# Altium footprint library Toi Library.PcbLib: 740 footprints (part 30 of 47)
Each footprint in its own frame and in the unit in brackets; x right, y up, seen from the top. Pads: shape width x height; smd on the part's side, far side on the other; paste and mask are expansions set on the pad; w line width, h text height; cw(c..) or ccw(c..) is an arc to the next point about the centre after c.
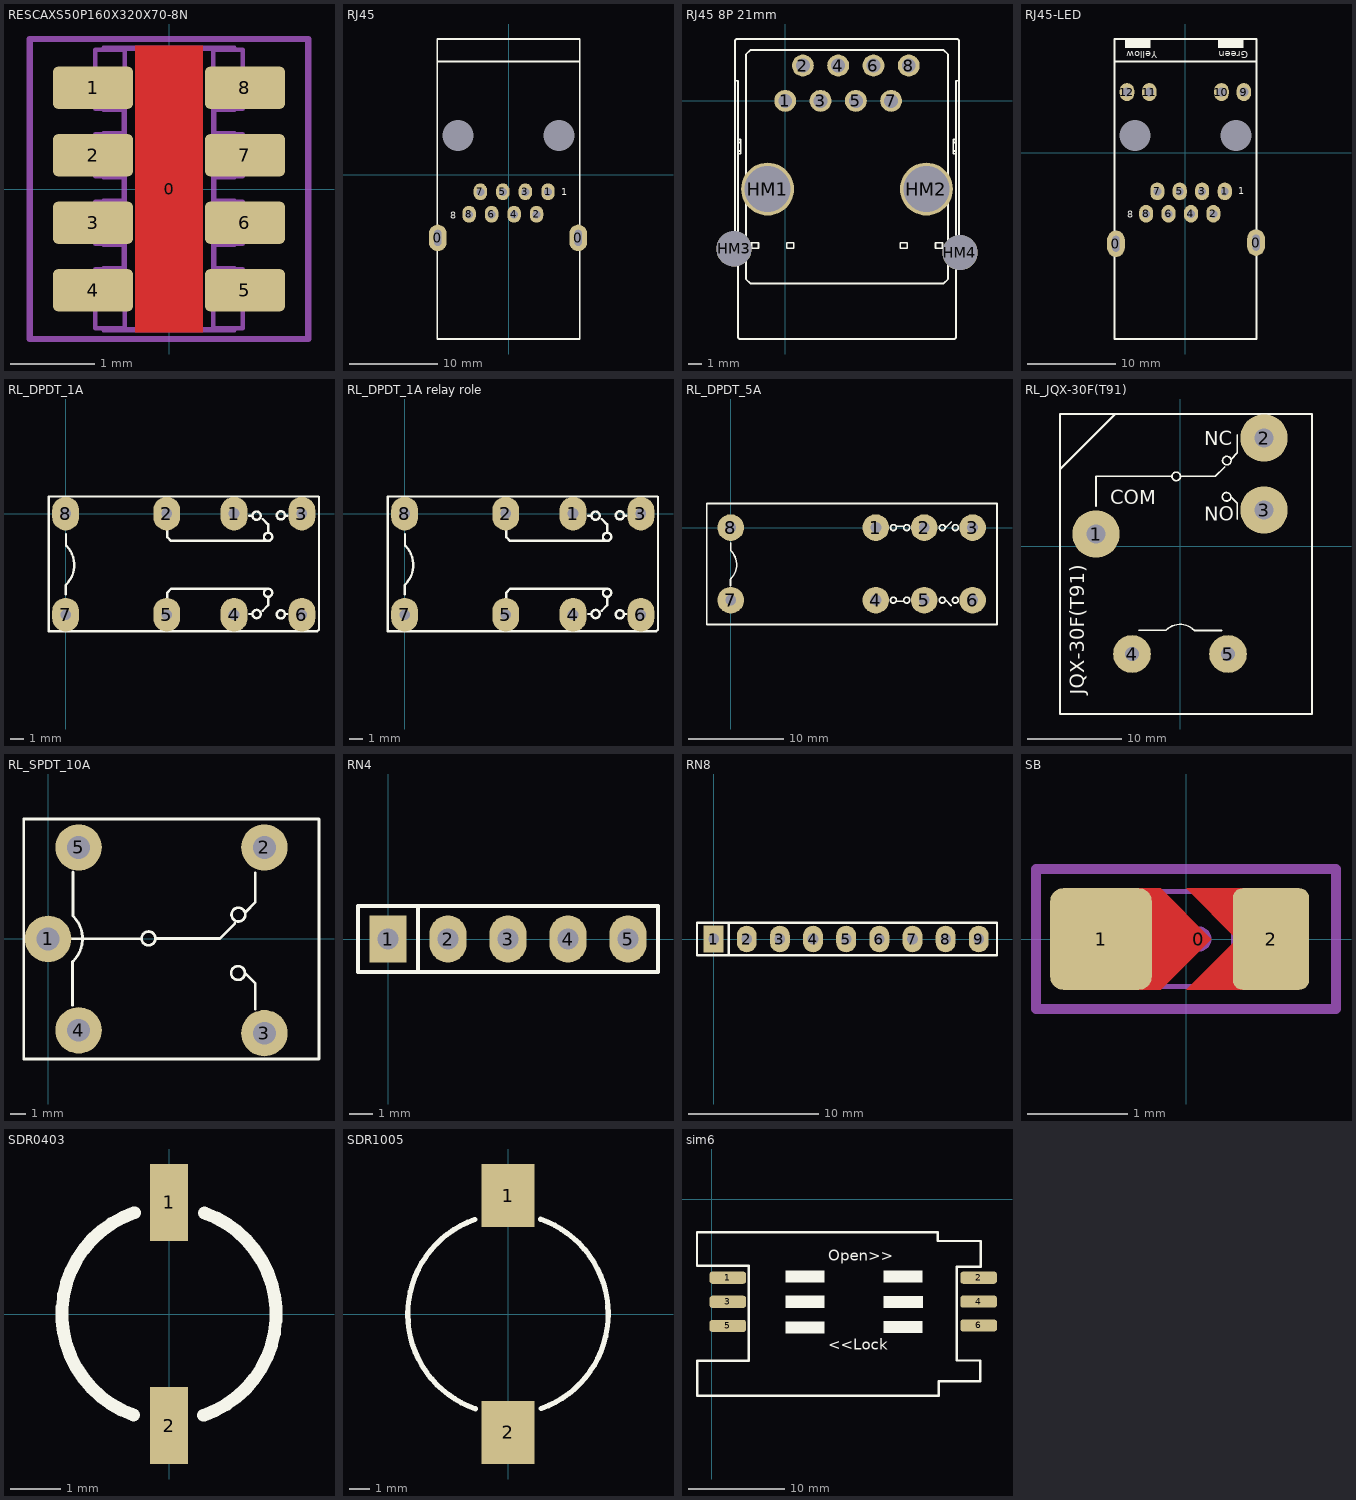
[diagram p29: the footprints below, top view; thin cyan lines are the x and y axes]

## RESCAXS50P160X320X70-8N [mm] "Resistor Pack, Body 1.6x3.2mm, 4x0603, IPC Medium Density"
height 0.7
pads (9):
  round 0.254 on Mech15: 0(0,0)
  rrect25% 0.95x0.5 smd: 1(-0.9,1.2) 2(-0.9,0.4) 3(-0.9,-0.4) 4(-0.9,-1.2) 5(0.9,-1.2) 6(0.9,-0.4) 7(0.9,0.4) 8(0.9,1.2)
Top Layer:
  pour cut-out: -0.4,1.7 0.4,1.7 0.4,-1.7 -0.4,-1.7
Top Solder:
  rectangle: -1.3,-1.2 -0.5,1.2
  region: 1.3,1.2 0.5,1.2 0.5,-1.2 1.3,-1.2
Mechanical 13:
  lines w0.05: -0.775,-1.65 -0.775,-1.675 0.775,-1.675 0.775,-1.65 ; -0.775,-0.95 -0.775,-0.938 -0.537,-0.938 -0.537,-0.663 -0.775,-0.663 -0.775,-0.65 ; -0.775,-0.15 -0.775,-0.138 -0.537,-0.138 -0.537,0.138 -0.775,0.138 -0.775,0.15 ; -0.775,0.65 -0.775,0.663 -0.537,0.663 -0.537,0.938 -0.775,0.938 -0.775,0.95 ; -0.775,1.65 -0.775,1.675 0.775,1.675 0.775,1.65 ; -0.525,-1.65 -0.875,-1.65 -0.875,-0.95 -0.525,-0.95 ; -0.525,-0.65 -0.875,-0.65 -0.875,-0.15 -0.525,-0.15 ; -0.525,0.15 -0.875,0.15 -0.875,0.65 -0.525,0.65 ; -0.525,0.95 -0.875,0.95 -0.875,1.65 -0.525,1.65 ; 0.525,-1.65 0.875,-1.65 0.875,-0.95 0.525,-0.95 ; 0.525,-0.65 0.875,-0.65 0.875,-0.15 0.525,-0.15 ; 0.525,0.15 0.875,0.15 0.875,0.65 0.525,0.65 ; 0.525,0.95 0.875,0.95 0.875,1.65 0.525,1.65 ; 0.775,-0.95 0.775,-0.938 0.537,-0.938 0.537,-0.663 0.775,-0.663 0.775,-0.65 ; 0.775,-0.15 0.775,-0.138 0.537,-0.138 0.537,0.138 0.775,0.138 0.775,0.15 ; 0.775,0.65 0.775,0.663 0.537,0.663 0.537,0.938 0.775,0.938 0.775,0.95 ; -0.525,-1.663 0.525,-1.663 0.525,1.663 -0.525,1.663 -0.525,-1.663
Mechanical 15:
  lines w0.076: -1.651,-1.778 1.651,-1.778 1.651,1.778 -1.651,1.778 -1.651,-1.778
3D body "RESCAXS50P32X16X70-8N.STEP": height 0.7, standoff 0, extent -0.875,-1.675 0.875,1.675

## RJ45 [mm] "Single Port RJ45 Connector with Intergrated Magetic (LAN) - NonLED"
pads (12):
  oval 2x3 hole 0.8 slot 1.8 at 90 deg: 0(-8.001,-7.112) 0(7.874,-7.112)
  oval 1.524x1.905 hole 0.9: 1(4.458,-1.905) 2(3.162,-4.445) 3(1.892,-1.905)
  oval 1.524x1.905 hole 0.9 paste-2539.97: 4(0.622,-4.445) 5(-0.648,-1.905) 6(-1.918,-4.445) 7(-3.188,-1.905) 8(-4.458,-4.445)
  round 2 hole 3.5 paste-2539.97: Hole1(-5.715,4.445) Hole1(5.715,4.445)
Top Overlay:
  lines w0.203: -8.05,12.825 8.05,12.825 ; -8.05,-18.542 -8.05,15.365 8.05,15.365 8.05,-18.542 3.39,-18.542 -3.898,-18.542 -8.05,-18.542
  text "1" at 5.969,-2.286 h0.8
  text "8" at -6.604,-4.953 h0.8
3D body "User Library-XPort.STEP": height 13.76, standoff -3.7, extent -8.98,-18.751 8.763,15.449

## RJ45 8P 21mm [mil]
pads (12):
  round 62 hole 39.37: 1(0,0) 2(50,100) 3(100,0) 4(150,100) 5(200,0) 6(250,100) 7(300,0) 8(350,100)
  round 150 hole 129.92: HM1(-50,-250) HM2(400,-250)
  round 100 hole 100: HM3(-145,-419.37) HM4(495,-430)
Top Overlay:
  lines w5: -142.52,57.09 -134.06,57.09 -134.06,-668.9 ccw(c-128.15,-668.9) -128.15,-674.8 478.15,-674.8 ccw(c478.15,-668.9) 484.06,-668.9 484.06,57.09 492.52,57.09 ; -134.06,-415.35 -136.61,-415.35 cw(c-136.61,-409.45) -142.52,-409.45 -142.52,169.29 cw(c-136.61,169.29) -136.61,175.2 486.61,175.2 cw(c486.61,169.29) 492.52,169.29 492.52,-409.45 cw(c486.61,-409.45) 486.61,-415.35 484.06,-415.35 ; -134.06,-150 -125.79,-150 -125.79,-109.84 -134.06,-109.84 ; -134.06,-142.13 -125.79,-142.13 ; -134.06,-117.72 -125.79,-117.72 ; -69.69,-305.68 cw(c-50,-250) -59.74,-308.25 ; -30.31,-305.68 ccw(c-50,-250) -30.31,-194.32 ; -5.22,-3.94 -5.22,3.94 ; 5.22,-3.94 5.22,3.94 ; 44.78,96.06 44.78,103.94 ; 55.22,96.06 55.22,103.94 ; 94.78,-3.94 94.78,3.94 ; 105.22,-3.94 105.22,3.94 ; 144.78,96.06 144.78,103.94 ; 155.22,96.06 155.22,103.94 ; 194.78,-3.94 194.78,3.94 ; 205.22,-3.94 205.22,3.94 ; 244.78,96.06 244.78,103.94 ; 255.22,96.06 255.22,103.94 ; 294.78,-3.94 294.78,3.94 ; 305.22,-3.94 305.22,3.94 ; 344.78,96.06 344.78,103.94 ; 355.22,96.06 355.22,103.94 ; 380.32,-305.68 cw(c400,-250) 380.32,-194.32 ; 400,-309.06 cw(c400,-250) 419.69,-305.68 ; 475.79,-142.13 484.06,-142.13 ; 475.79,-117.72 484.06,-117.72 ; 484.06,-150 475.79,-150 475.79,-109.84 484.06,-109.84 ; -111.02,-505.51 -99.21,-517.32 449.21,-517.32 461.02,-505.51 461.02,131.89 449.21,143.7 -99.21,143.7 -111.02,131.89 -111.02,-505.51 ; -95.67,-417.72 -75.98,-417.72 -75.98,-401.97 -95.67,-401.97 -95.67,-417.72 ; -69.69,-290.77 cw(c-50,-250) -69.69,-209.23 -69.69,-290.77 ; -30.31,-290.77 ccw(c-50,-250) -30.31,-209.23 -30.32,-290.77 ; -6.89,-3.94 6.89,-3.94 6.89,3.94 -6.89,3.94 -6.89,-3.94 ; 4.33,-417.72 24.02,-417.72 24.02,-401.97 4.33,-401.97 4.33,-417.72 ; 43.11,96.06 56.89,96.06 56.89,103.94 43.11,103.94 43.11,96.06 ; 93.11,-3.94 106.89,-3.94 106.89,3.94 93.11,3.94 93.11,-3.94 ; 143.11,96.06 156.89,96.06 156.89,103.94 143.11,103.94 143.11,96.06 ; 193.11,-3.94 193.11,3.94 206.89,3.94 206.89,-3.94 193.11,-3.94 ; 243.11,96.06 243.11,103.94 256.89,103.94 256.89,96.06 243.11,96.06 ; 293.11,-3.94 306.89,-3.94 306.89,3.94 293.11,3.94 293.11,-3.94 ; 325.98,-417.72 345.67,-417.72 345.67,-401.97 325.98,-401.97 325.98,-417.72 ; 343.11,96.06 356.89,96.06 356.89,103.94 343.11,103.94 343.11,96.06 ; 380.32,-290.77 cw(c400,-250) 380.32,-209.23 380.32,-290.77 ; 419.69,-290.77 ccw(c400,-250) 419.69,-209.23 419.69,-290.77 ; 425.98,-417.72 445.67,-417.72 445.67,-401.97 425.98,-401.97 425.98,-417.72
3D body "User Library-RJ-45 (TJ7-8P8C).STEP": height 539.37, standoff -157.48, extent -139.96,-667.52 489.96,175

## RJ45-LED [mm] "Single Port RJ45 Connector with Intergrated Magetic (LAN) - Tranformer & LED"
pads (16):
  oval 2x3 hole 0.8 slot 1.8 at 90 deg: 0(-7.874,-10.287) 0(8.001,-10.16)
  oval 1.6x2 hole 0.9: 1(4.458,-4.355) 2(3.162,-6.895) 3(1.892,-4.355)
  oval 1.6x2 hole 0.9 paste-2539.97: 4(0.622,-6.895) 5(-0.648,-4.355) 6(-1.918,-6.895) 7(-3.188,-4.355) 8(-4.458,-6.895)
  oval 1.651x2.032 hole 1: 9(6.625,6.895) 10(4.085,6.895) 11(-4.085,6.895) 12(-6.625,6.895)
  round 2 hole 3.5 paste-2539.97: Hole1(-5.715,1.995) Hole1(5.715,1.995)
Top Overlay:
  rectangle: -6.858,11.901 -3.937,12.79
  rectangle: 3.683,11.901 6.604,12.79
  lines w0.203: -8.05,10.375 8.05,10.375 ; -8.05,-21.082 -8.05,12.915 8.05,12.915 8.05,-21.082 -8.05,-21.082
  text "Yellow" at -3.175,11.52 h0.8
  text "Green" at 7.112,11.52 h0.8
  text "1" at 5.969,-4.699 h0.8
  text "8" at -6.604,-7.366 h0.8
3D body "User Library-XPort.STEP": height 13.76, standoff -3.7, extent -8.872,-21.246 8.872,12.954

## RL_DPDT_1A [mil] "Reley DPDT, 8 pin, 1A, W400mil, L800mil,H 300mil"
height 300
pads (8):
  oval 80x100 hole 32: 1(500,0) 2(300,0) 3(701,0) 4(500,-300) 5(300,-300) 6(701,-300) 7(0,-300) 8(0,0)
Top Overlay:
  circle w7: c638.76,-299 r12.24
  circle w7: c566.76,-298 r12.24
  circle w7: c600.76,-235 r12.24
  circle w7: c600.76,-69 r12.24
  circle w7: c566.76,-6 r12.24
  circle w7: c638.76,-5 r12.24
  lines w7: 0,-239 0,-212 ; 1,-211 ccw(c-56.5,-152.5) 2,-95 ; 1,-94 1,-61 ; 302,-255 302,-234 313,-223 599,-223 ; 302,-42 302,-70 313,-81 599,-81 ; 544,-298 552,-298 ; 544,-6 552,-6 ; 585,-288 601,-272 601,-249 ; 585,-16 601,-32 601,-55 ; 653,-298 658,-298 ; 653,-6 658,-6 ; -50,-349 -50,51 750,51 752,49 752,-344 747,-349 -50,-349
3D body: height 484.25, standoff -118.11, extent -59.45,-340 759.45,45.83

## RL_DPDT_1A relay role [mil] "Reley DPDT, 8 pin, 1A, W400mil, L800mil,H 300mil"
height 300
pads (8):
  oval 80x100 hole 32: 1(500,0) 2(300,0) 3(701,0) 4(500,-300) 5(300,-300) 6(701,-300) 7(0,-300) 8(0,0)
Top Overlay:
  circle w7: c638.76,-5 r12.24
  circle w7: c566.76,-6 r12.24
  circle w7: c600.76,-69 r12.24
  circle w7: c600.76,-235 r12.24
  circle w7: c566.76,-298 r12.24
  circle w7: c638.76,-299 r12.24
  lines w7: 0,-239 0,-212 ; 1,-211 ccw(c-56.5,-152.5) 2,-95 ; 1,-94 1,-61 ; 302,-255 302,-234 313,-223 599,-223 ; 302,-42 302,-70 313,-81 599,-81 ; 544,-298 552,-298 ; 544,-6 552,-6 ; 585,-288 601,-272 601,-249 ; 585,-16 601,-32 601,-55 ; 653,-298 658,-298 ; 653,-6 658,-6 ; -50,-349 747,-349 752,-344 752,49 750,51 -50,51 -50,-349
3D body: height 484.25, standoff -118.11, extent -59.45,-340 759.45,45.83

## RL_DPDT_5A [mil] "Reley DPDT, 8 pin, 5A, W500mil, L1100mil,H 950mil"
height 300
pads (8):
  round 110 hole 45: 1(600,0) 2(800,0) 3(1000,0) 4(600,-300) 5(800,-300) 6(1000,-300) 7(0,-300) 8(0,0)
Top Overlay:
  circle w7: c928.76,-300 r12.24
  circle w7: c874.76,-300 r12.24
  circle w7: c727.76,-300 r12.24
  circle w7: c672.76,-300 r12.24
  circle w7: c672.76,0 r12.24
  circle w7: c727.76,0 r12.24
  circle w7: c874.76,0 r12.24
  circle w7: c928.76,0 r12.24
  lines w7: -1,-240 -1,-213 ; 0,-212 ccw(c-57.5,-153.5) 1,-96 ; 0,-95 0,-62 ; 687,-305 716,-305 ; 687,5 716,5 ; 888,-299 912,-323 ; 888,-1 912,23 ; -99,-401 1101,-401 1101,100 -99,100 -99,-401

## RL_JQX-30F(T91) [mm] "Relay SPDT, 5 pin, 30A,W 32.1mm, L 26.9mil, H 28.0mil"
height 20.32
pads (5):
  round 5 hole 2: 1(-8.89,1.27) 2(8.89,11.43) 3(8.89,3.81)
  round 4 hole 1.5: 4(-5.08,-11.43) 5(5.08,-11.43)
Top Overlay:
  circle w0.178: c4.933,5.207 r0.452
  circle w0.178: c4.958,9.042 r0.452
  circle w0.178: c-0.401,7.366 r0.452
  lines w0.178: -8.89,4.191 -8.89,7.366 -0.889,7.366 ; -4.369,-8.915 -1.473,-8.915 ; -1.448,-8.89 cw(c0.013,-10.376) 1.499,-8.915 ; 0.102,7.366 3.734,7.366 4.724,8.357 ; 1.524,-8.941 4.394,-8.941 ; 5.385,5.207 6.071,4.521 6.071,2.845 ; 5.41,9.195 6.071,9.855 6.071,11.786
  lines w0.254: -12.7,8.128 -6.858,13.97 ; -12.7,-17.78 -12.7,13.97 13.97,13.97 13.97,-17.78 -12.7,-17.78
  text "COM" at -7.366,4.445 h1.52
  text "JQX-30F(T91)" at -10.16,-15.748 h1.52
  text "NC" at 2.54,10.668 h1.52
  text "NO" at 2.54,2.667 h1.52

## RL_SPDT_10A [mm] "Relay SPDT, 5 pin, 10A,W 650mil, L 800mil, H 800mil"
height 20.32
pads (5):
  round 3.048 hole 1.5: 1(0,0) 2(14.2,6) 3(14.2,-6.192) 4(2,-6) 5(2,6)
Top Overlay:
  circle w0.178: c12.491,1.596 r0.452
  circle w0.178: c12.466,-2.24 r0.452
  circle w0.178: c6.589,0.028 r0.452
  lines w0.178: 0.888,0.003 6.076,0.003 ; 1.606,-4.366 1.606,-1.496 ; 1.631,-1.47 ccw(c0.171,0.016) 1.657,1.476 ; 1.631,1.502 1.631,4.397 ; 7.092,0.028 11.267,0.028 ; 11.267,0.026 12.258,1.017 ; 12.918,-2.24 13.604,-2.926 13.604,-4.602 ; 12.944,1.748 13.604,2.408 13.604,4.339 ; -1.61,-7.889 17.78,-7.889 17.78,7.874 -1.61,7.874 -1.61,-7.889
  lines w0.254: 14.062,5.905 14.171,6.015
3D body "User Library-SONGLE Relay SRU-12VDC-SL-C.STEP": height 15.3, standoff -5, extent -1.4,-7.77 17.7,7.73

## RN4 [mil] "R SIP4, 5 Pin"
height 200
pads (5):
  rect 62x78.74 hole 35: 1(0,0)
  oval 62x78.74 hole 35: 2(100,0) 3(200,0) 4(300,0) 5(400,0)
Top Overlay:
  lines w7: 50,-55 50,55 ; -50,-55 450,-55 450,55 -50,55 -50,-55

## RN8 [mil] "R SIP8, 9 Pin"
height 200
pads (9):
  rect 60x80 hole 32: 1(0,0)
  oval 60x80 hole 32: 2(100,0) 3(200,0) 4(300,0) 5(400,0) 6(500,0) 7(600,0) 8(700,0) 9(800,0)
Top Overlay:
  lines w7: 46,-49 46,47 ; -50,-49 855,-49 855,49 -50,49 -50,-49
3D body "SW3dPS-Resistor Networks-1.STEP": height 259.29, standoff -75.35, extent -42.91,-26.21 842.91,23

## SB [mil] "Chip Resistor, Body 1.6x0.8mm, 0603, IPC Medium Density"
height 21.65
pads (3):
  round 10 on Mech15: 0(5,0)
  rrect25% 40x40 smd: 1(-33.46,0)
  rrect25% 30x40 smd: 2(33.46,0)
Top Layer:
  region: 0,20 5,20 25,20 25,0 25,-20 5,-20 0,-20 20,0
  region: -25,20 -10,20 10,0 -10,-20 -25,-20 -15,0
Mechanical 13:
  lines w1.97: -34.45,-18.7 -18.7,-18.7 -18.7,18.7 -34.45,18.7 -34.45,-18.7 ; -18.7,-18.66 18.7,-18.66 -18.7,-18.66 ; -18.7,18.64 18.7,18.66 -18.7,18.64 ; 18.7,-18.7 18.7,18.7 34.45,18.7 34.45,-18.7 18.7,-18.7
Mechanical 15:
  lines w3.94: -59.06,-27.56 59.06,-27.56 59.06,27.56 -59.06,27.56 -59.06,-27.56
3D body "RES 0603 (1608 metric).STEP": height 21.14, standoff -0.51, extent -34.44,-18.69 34.45,18.71

## SDR0403 [mil]
pads (2):
  rect 30x60 smd: 1(0,87) 2(0,-87)
Top Overlay:
  lines w10: -27.59,-78.83 cw(c0,0) -27.01,79.03 ; 27.01,-79.03 ccw(c0,0) 27.59,78.83
3D body "User Library-Inductor SDR0403 Series.STEP": height 128.55, standoff 0.6, extent -88.58,-86.66 88.58,86.66

## SDR0805 [mm]
3D body "User Library-inductor SDR0805.STEP": height 4.57, standoff -0.73, extent -3.9,-3.9 3.9,3.9

## SDR1005 [mil]
pads (2):
  rect 100x120 smd: 1(0,225) 2(0,-225)
Top Overlay:
  lines w10: -63.37,179.54 ccw(c0,0) -61.63,-180.14 ; 61.63,180.14 cw(c0,0) 63.37,-179.54
3D body "User Library-SDR1005.STEP": height 197.45, standoff 0.6, extent -196.85,-250 196.85,250

## sim6 [mil]
pads (6):
  rrect50% 150x50 smd: 1(65,-320) 2(1088.62,-320) 3(65,-418.43) 4(1088.62,-417.5) 5(65,-516.85) 6(1088.62,-515)
Top Overlay:
  rectangle: 300,-340 460,-290
  rectangle: 299.84,-443.31 459.84,-393.31
  rectangle: 299.84,-548.03 459.84,-498.03
  rectangle: 700,-340 860,-290
  rectangle: 700.79,-444.49 860.79,-394.49
  rectangle: 700,-545.67 860,-495.67
  lines w10: -61.02,-271.26 150,-271.26 150,-659.06 -60.63,-659.06 -60.63,-801.57 925.2,-801.57 925.2,-742.91 1095.28,-742.91 1095.28,-657.87 1000,-657.87 1000,-274.8 1097.24,-274.8 1097.24,-170.08 921.26,-170.08 921.26,-134.65 -61.02,-134.65 -61.02,-271.26
  text "Open>>" at 475,-250 h45
  text "<<Lock" at 475,-615 h45
3D body "User Library-SIM5060-6-0-26-01-A.STEP": height 102.97, standoff -26.96, extent -66.14,-806.69 1100.79,-129.53